# Altium integrated library Mastermind.IntLib: 985 symbols (part 3 of 6) (continued)
## PatchAntenna (continued)
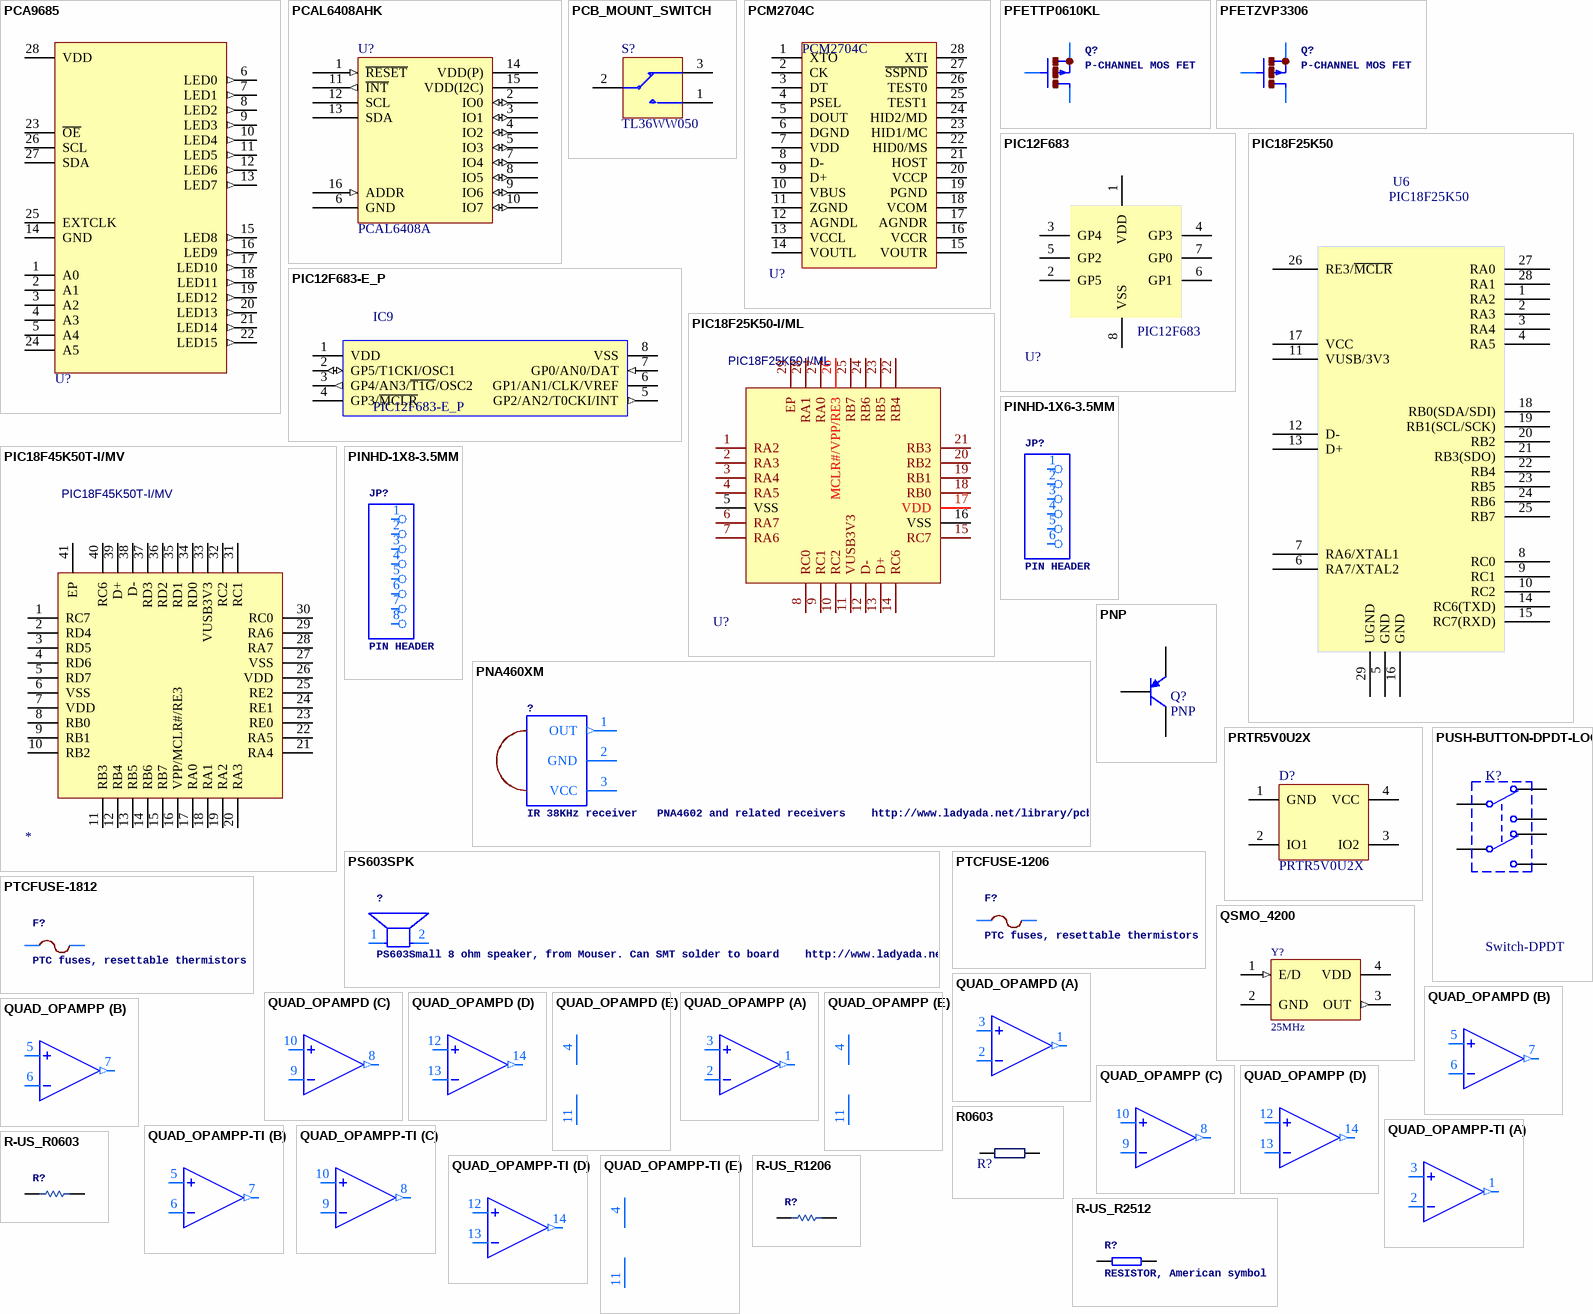
[diagram p20: symbols PCA9685 to R-US_R2512]

## PCA9685
designator U?, comment PCA9685 - 16 Channel 12-Bit I2C PWM Controller    5.0V tolerant 16 channel, 12-bit I2C PWM controller with 25mA per output (max. 400mA total)   Digikey: 568-5931-1-ND  (value not drawn)
footprint TSSOP28
pins: 1 A0, 2 A1, 3 A2, 4 A3, 5 A4, 6 LED0 (out), 7 LED1 (out), 8 LED2 (out), 9 LED3 (out), 10 LED4 (out), 11 LED5 (out), 12 LED6 (out), 13 LED7 (out), 14 GND, 15 LED8 (out), 16 LED9 (out), 17 LED10 (out), 18 LED11 (out), 19 LED12 (out), 20 LED13 (out), 21 LED14 (out), 22 LED15 (out), 23 ~{OE}, 24 A5, 25 EXTCLK, 26 SCL, 27 SDA, 28 VDD

## PCAL6408AHK
designator U?, comment PCAL6408A
8-bit I2C-bus I/O expander with interrupt output; Part Number: PCAL6408AHK; Manufacturer: NXP Semiconductors; 2nd source part number: 771-PCAL6408AHKX; Artikkelnr Noca: N.A.; Manufacturer Part Number: PCAL6408AHK; Datasheet: http://www.nxp.com/documents/data_sheet/PCAL6408A.pdf; Footprint Doc: XQFN-16; LatestRevisionDate: 2015-04-29; Pin Count: 16; Publisher: Nordic Semiconductor; Published: 2015-04-29; Value: PCAL6408A; Note: *; Supplier: Digi-Key; Supplier part number: 568-9944-2-ND; 2nd source Supplier: Mouser; Artikkelnr Simpro: N.A.
footprint XQFN40P180X260X50-16N
pins: 1 ~{RESET} (in), 2 IO0 (io), 3 IO1 (io), 4 IO2 (io), 5 IO3 (io), 6 GND (power), 7 IO4 (io), 8 IO5 (io), 9 IO6 (io), 10 IO7 (io), 11 ~{INT} (out), 12 SCL (power), 13 SDA, 14 VDD(P) (power) "VDD 2.3V - 5.5V", 15 VDD(I2C) (power), 16 ADDR (in)

## PCB_MOUNT_SWITCH
designator S?, comment TL36WW050
SPDT Subminiature Toggle Switch; Supplier: FARNELL; Supplier Code: 150-559
footprint PCB_SWITCH
3D model SPST_Switch (PCB3D Model)
pins: 1, 2, 3

## PCM2704C
designator U?
USB to Audio
footprint SOP65P780X200-28N
pins: 1 XTO, 2 CK, 3 DT, 4 PSEL, 5 DOUT, 6 DGND, 7 VDD, 8 D-, 9 D+, 10 VBUS, 11 ZGND, 12 AGNDL, 13 VCCL, 14 VOUTL, 15 VOUTR, 16 VCCR, 17 AGNDR, 18 VCOM, 19 PGND, 20 VCCP, 21 HOST, 22 HID0/MS, 23 HID1/MC, 24 HID2/MD, 25 TEST1, 26 TEST0, 27 ~{SSPND}, 28 XTI

## PFETTP0610KL
designator Q?, comment P-CHANNEL MOS FET
footprint TO92-OVAL
pins: 1 S, 2 G, 3 D

## PFETZVP3306
designator Q?, comment P-CHANNEL MOS FET
footprint TO92-OVAL
pins: 1 S, 2 G, 3 D

## PIC12F683
designator U?  Name: PIC12F683
footprint SOIC-8E (SOIC, 8-Leads, Body 4.90x3.90mm, Pitch 1.27mm, IPC Medium Density)
pins: 1 VDD (power), 2 GP5, 3 GP4, 4 GP3 (power), 5 GP2, 6 GP1, 7 GP0, 8 VSS

## PIC12F683-E_P
designator IC9
Integrated Circuit; DETAILS: PIC series Microcontroller IC 8-Bit 20MHz 3.5KB (2K x 14) FLASH 8-PDIP; MFG: Microchip Technology; MFGPN: PIC12F683-E/P; VALUE: IC MCU 8BIT 3.5KB FLASH; PACKAGE: 8DIP; URL: https://www.digikey.com/en/products/detail/microchip-technology/PIC12F683-E-P/613448?s=N4IgTCBcDaIAoEkDCBGMAxAbADgMwFoBRAejhAF0BfIA
footprint SOIC-8E (SOIC, 8-Leads, Body 4.90x3.90mm, Pitch 1.27mm, IPC Medium Density)
pins: 1 VDD (power), 2 GP5/T1CKI/OSC1 (io), 3 GP4/AN3/~{T1G}/OSC2 (out), 4 GP3/~{MCLR}, 5 GP2/AN2/T0CKI/INT (out), 6 GP1/AN1/CLK/VREF, 7 GP0/AN0/DAT (in), 8 VSS (power)

## PIC18F25K50
designator U6
Manufacturer 1: Microchip / Atmel; Manufacturer Part Number 1: ATMEGA16U2-AU; Core Architecture: AVR; Data Bus Width: 8b; RAM Size: 512B; Interface: SPI,UART,USB,USART,Serial; Number of Timers/Counters: 2; Max Supply Voltage: 5.5V; Min Supply Voltage: 2.7V; Frequency: 16MHz; Number of Programmable I/O: 22; Watchdog Timer: Yes; Memory Type: FLASH; Memory Size: 16KB; Number of PWM Channels: 5; Oscillator Type: Internal; Number of SPI Channels: 1; Peripherals: Brown-out Detect/Reset,POR,PWM,WDT; Supplier 1: Digi-Key; Stock 1: 1738; Pricing 1: 1=2.45000, 25=2.25000, 100=2.04000 (USD); RoHS: Yes; Mount: Surface Mount; Case/Package: A; Number of Pins: 32; Contact Plating: Tin,Matte; Min Operating Temperature: -40°C; Max Operating Temperature: 85°C; Package Quantity: 1250; Packaging: Tray; Max Frequency: 16MHz; Number of I/Os: 22; Length: 7mm; Height: 1.05mm; Width: 7mm; REACH SVHC: No SVHC; Lead Free: Lead Free; ComponentLink1URL: https://datasheet.ciiva.com/13036/doc7799-28769-13036800.pdf?src-supplier=Mouser; ComponentLink1Description: https://datasheet.ciiva.com/13036/doc7799-28769-13036800.pdf?src-supplier=Mouser; ComponentLink2URL: https://datasheet.ciiva.com/22651/doc7799-22651110.pdf?src-supplier=Farnell; ComponentLink2Description: https://datasheet.ciiva.com/22651/doc7799-22651110.pdf?src-supplier=Farnell; Supplier Part Number 1: ATMEGA16U2-AU-ND
footprint QFN28-P0.65
pins: 1 RA2, 2 RA3, 3 RA4, 4 RA5, 5 GND, 6 RA7/XTAL2, 7 RA6/XTAL1, 8 RC0, 9 RC1, 10 RC2, 11 VUSB/3V3, 12 D-, 13 D+, 14 RC6(TXD), 15 RC7(RXD), 16 GND, 17 VCC, 18 RB0(SDA/SDI), 19 RB1(SCL/SCK), 20 RB2, 21 RB3(SDO), 22 RB4, 23 RB5, 24 RB6, 25 RB7, 26 RE3/~{MCLR}, 27 RA0, 28 RA1, 29 UGND

## PIC18F25K50-I/ML
designator U?
BOM_Manufacturer: MICROCHIP(美国微芯); Contributor: LCSC; BOM_Supplier: LCSC; BOM_Supplier Part: C184559; BOM_Manufacturer Part: PIC18F25K50-I/ML; BOM_JLCPCB Part Class: Extended Part; spicePre: U; spiceSymbolName: PIC18F25K50-I/ML
footprint QFN-28_L6.0-W6.0-P0.65-BL-EP
pins: 1 RA2, 2 RA3, 3 RA4, 4 RA5, 5 VSS, 6 RA7, 7 RA6, 8 RC0, 9 RC1, 10 RC2, 11 VUSB3V3, 12 D-, 13 D+, 14 RC6, 15 RC7, 16 VSS, 17 VDD, 18 RB0, 19 RB1, 20 RB2, 21 RB3, 22 RB4, 23 RB5, 24 RB6, 25 RB7, 26 MCLR#/VPP/RE3, 27 RA0, 28 RA1, 29 EP

## PIC18F45K50T-I/MV
designator *
BOM_Manufacturer: Microchip Tech; Contributor: LCSC; BOM_Supplier: LCSC; BOM_Supplier Part: C624362; BOM_Manufacturer Part: PIC18F45K50T-I/MV; BOM_JLCPCB Part Class: Extended Part; spicePre: U; spiceSymbolName: PIC18F45K50T-I/MV
footprint QFN-40_L5.0-W5.0-P0.40-BL-EP3.7
pins: 1 RC7, 2 RD4, 3 RD5, 4 RD6, 5 RD7, 6 VSS, 7 VDD, 8 RB0, 9 RB1, 10 RB2, 11 RB3, 12 RB4, 13 RB5, 14 RB6, 15 RB7, 16 VPP/MCLR#/RE3, 17 RA0, 18 RA1, 19 RA2, 20 RA3, 21 RA4, 22 RA5, 23 RE0, 24 RE1, 25 RE2, 26 VDD, 27 VSS, 28 RA7, 29 RA6, 30 RC0, 31 RC1, 32 RC2, 33 VUSB3V3, 34 RD0, 35 RD1, 36 RD2, 37 RD3, 38 D-, 39 D+, 40 RC6, 41 EP

## PINHD-1X6-3.5MM
designator JP?, comment PIN HEADER
footprint 1X06-3.5MM
pins: 1, 2, 3, 4, 5, 6

## PINHD-1X8-3.5MM
designator JP?, comment PIN HEADER
footprint 1X08-3.5MM
pins: 1, 2, 3, 4, 5, 6, 7, 8

## PNA460XM
designator ?, comment IR 38KHz receiver   PNA4602 and related receivers    http://www.ladyada.net/library/pcb/eaglelibrary.html
footprint PNA460XM
pins: 1 OUT (out), 2 GND (power), 3 VCC (power)

## PNP
designator Q?
PNP Bipolar Transistor; Published: 8-Jun-2000; LatestRevisionDate: 15-Jan-2003; LatestRevisionNote: PCB Footprint 'BCY-W3/D4.7' replaced; DatasheetVersion: 1997; PackageVersion: Sep-1998; PackageReference: TO-92A; Publisher: Altium Limited; PackageDescription: TO, Flat Index; 3 In-Line, Axial Leads; Body Dia. 4.5mm; Leads 0.51 x 0.48 mm (max); ComponentLink1Description: Manufacturer Link; ComponentLink1URL: http://www.fairchildsemi.com/; ComponentLink2Description: Datasheet; ComponentLink2URL: http://www.fairchildsemi.com/ds/2N%2F2N3906.pdf
simulation model 2N3906 (PNP)
signal-integrity model 2N3906
footprint SOT23
pins: 1 E, 2 B, 3 C

## PRTR5V0U2X
designator D?
Ultra low capacitance double rail-to-rail ESD protection diode; Manufacturer: NXP; 2nd source part number: 152-4157; Artikkelnr Noca: 10069015; Artikkelnr Simpro: N.A.; Part Number: PRTR5V0U2X; Manufacturer Part Number: PRTR5V0U2X; Datasheet: http://www.farnell.com/datasheets/109718.pdf; LatestRevisionDate: 2012-06-11; Publisher: Nordic Semiconductor; Published: 2012-06-11; Value: PRTR5V0U2X; Note: *; Supplier: Digi-Key; Supplier part number: 568-4140-1-ND; 2nd source Supplier: Farnell; Footprint Doc: SOT-143B
footprint SOT190P230X110-4L
pins: 1 GND, 2 IO1, 3 IO2, 4 VCC

## PS603SPK
designator ?, comment PS603Small 8 ohm speaker, from Mouser. Can SMT solder to board    http://www.ladyada.net/library/pcb/eaglelibrary.html
footprint PS603
pins: 1, 2

## PTCFUSE-1206
designator F?, comment PTC fuses, resettable thermistors
footprint F1206
footprint F1206 - NO
pins: 1, 2

## PTCFUSE-1812
designator F?, comment PTC fuses, resettable thermistors
footprint 1812
pins: 1, 2

## PUSH-BUTTON-DPDT-LOCK
designator K?, comment Switch-DPDT
Dual-Pole Dual-Throw button; Published: 24-Mar-1999; LatestRevisionDate: 17-Jul-2002; LatestRevisionNote: Re-released for DXP Platform.; PackageReference: DIP-P8; Publisher: Altium Limited; PackageDescription: Relay; 8 Leads
footprint SW-TH_BTSA-X-P-14
footprint SW-TH_BTSA-X-P-15
pins: 1, 2, 3, 4, 5, 6

## QSMO_4200
designator Y?, comment 25MHz
Surface Mount Crystal Oscillator
footprint QSMO_4200
3D model crystal (PCB3D Model)
pins: 1 E/D (in) "Low Disables Clock", 2 GND (power), 3 OUT (out) "Output", 4 VDD (power)

## QUAD_OPAMPD
designator IC?, comment OP AMPStandard quad package  (value not drawn)
footprint SO14
part A pins: 1 OUT (out), 2 -IN, 3 +IN
part B pins: 5 +IN, 6 -IN, 7 OUT (out)
part C pins: 8 OUT (out), 9 -IN, 10 +IN
part D pins: 12 +IN, 13 -IN, 14 OUT (out)
part E pins: 4 V+ (power), 11 V- (power)

## QUAD_OPAMPP
designator IC?, comment OP AMPStandard quad package  (value not drawn)
footprint DIL14
part A pins: 1 OUT (out), 2 -IN, 3 +IN
part B pins: 5 +IN, 6 -IN, 7 OUT (out)
part C pins: 8 OUT (out), 9 -IN, 10 +IN
part D pins: 12 +IN, 13 -IN, 14 OUT (out)
part E pins: 4 V+ (power), 11 V- (power)

## QUAD_OPAMPP-TI
designator IC?, comment OP AMPStandard quad package  (value not drawn)
footprint DIL14-LARDO
part A pins: 1 OUT (out), 2 -IN, 3 +IN
part B pins: 5 +IN, 6 -IN, 7 OUT (out)
part C pins: 8 OUT (out), 9 -IN, 10 +IN
part D pins: 12 +IN, 13 -IN, 14 OUT (out)
part E pins: 4 V+ (power), 11 V- (power)

## R0603
designator R?, comment 5%  (value not drawn)
Chip resistor
footprint R0805
footprint R0603
footprint R1206
pins: 1, 2

## R-US_R0603
designator R?
RESISTOR, American symbol; Parameter 1: *
footprint R0603
pins: 1, 2

## R-US_R1206
designator R?  (value not drawn)
RESISTOR, American symbol
footprint R1206
pins: 1, 2

## R-US_R2512
designator R?, comment RESISTOR, American symbol
footprint R2512
pins: 1, 2

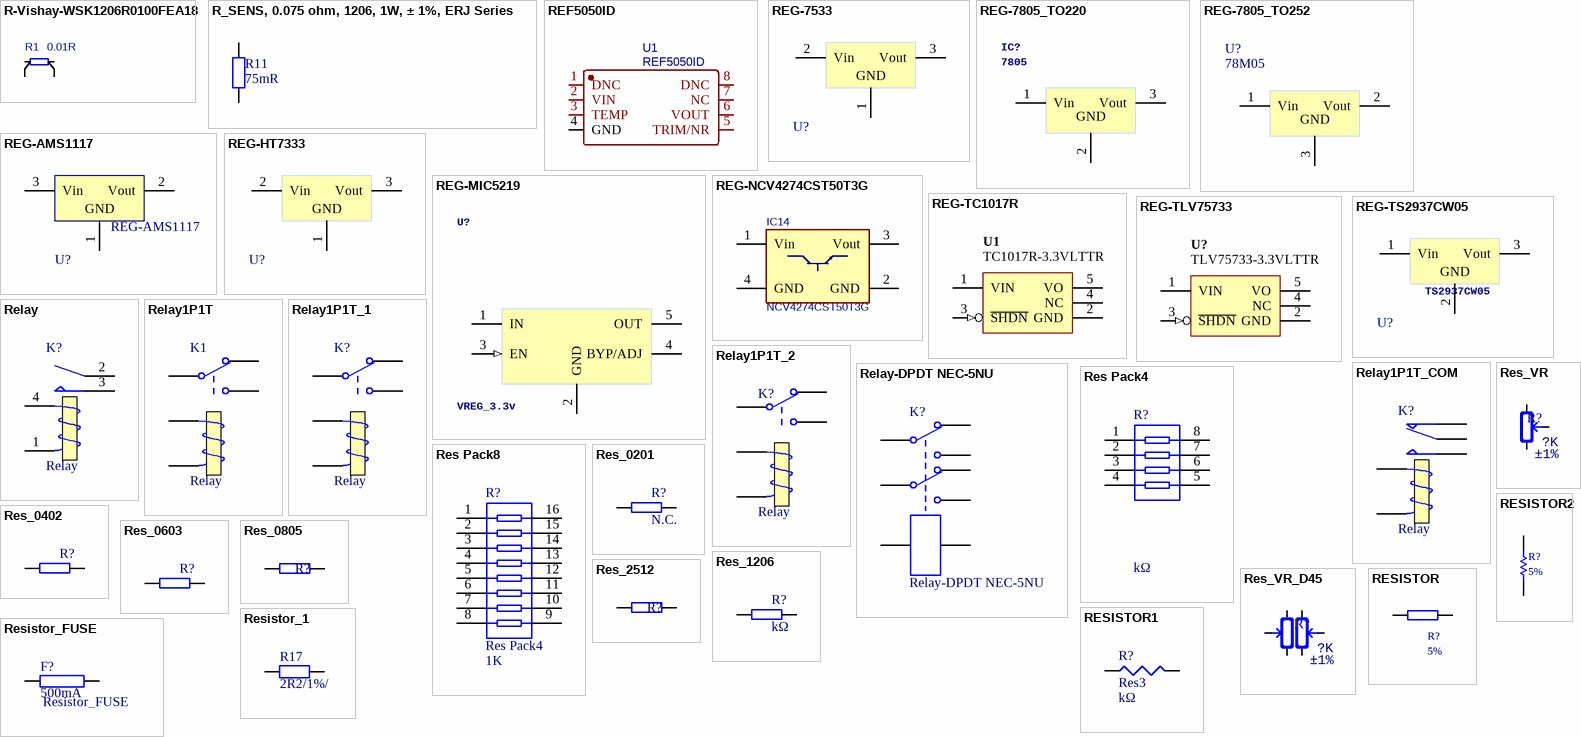
[diagram p21: symbols R-Vishay-WSK1206R0100FEA18 to Resistor_FUSE]

## R-Vishay-WSK1206R0100FEA18
designator R1, comment 0.01R
10 mOhms ±1% 0.5W,Chip Resistor 1206 (3216 Metric) Current Sense, Moisture Resistant, Pulse Withstanding Metal Element; Manufacturer Name: Vishay; Manufacturer Part No.: WSK1206R0100FEA18; Rating: 0.5W; Tolerance: 1%; Value: 0.01R; ClassName: Power_Poly
footprint RESWSK1206 (4-terminal resistor 1206 (3216 metric))
pins: 1, 2, 3, 4

## R_SENS, 0.075 ohm, 1206, 1W, ± 1%, ERJ Series
designator R11, comment 75mR
SMD Chip Resistor, Thick Film, Current Sense Resistors - SMD 1W 0.075ohm 1%; MPN: ERJ-8BWFR075V; VoltageRating: 50V; Temp coefficient: *ppm; MF: Panasonic Electronic Components; Precision: 1%; PowerRating: 1W; Resistance: 75mR
footprint R1206 (1206 resistor)
pins: 1, 2

## REF5050ID
designator U1
BOM_Manufacturer: TI(德州仪器); Contributor: LCSC; BOM_Supplier: LCSC; BOM_Supplier Part: C1575348; BOM_Manufacturer Part: REF5050ID; link: https://atta.szlcsc.comnull; BOM_JLCPCB Part Class: Extended Part; spicePre: U; spiceSymbolName: REF5050ID
footprint SOIC-8E (SOIC, 8-Leads, Body 4.90x3.90mm, Pitch 1.27mm, IPC Medium Density)
pins: 1 DNC, 2 VIN, 3 TEMP, 4 GND, 5 TRIM/NR, 6 VOUT, 7 NC, 8 DNC

## REG-7533
designator U?, comment HT7333  (value not drawn)
3.3VLTTR 250ma, 3.3V Micropower Low Dropout Regulator, 5-Pin SC70-5; @Comment: *
footprint SOT89-3
pins: 1 GND, 2 Vin, 3 Vout

## REG-7805_TO220
designator IC?, comment 7805
5V Linear Regulator
footprint TO220
pins: 1 Vin, 2 GND, 3 Vout

## REG-7805_TO252
designator U?, comment 78M05
5V Linear Regulator
footprint TO252
pins: 1 Vin, 2 Vout, 3 GND

## REG-AMS1117
designator U?
3V3 700ma Linear Regualtor; Max Input Voltage: 12V
footprint SOT223
footprint SOT89-3
pins: 1 GND, 2 Vout, 3 Vin

## REG-HT7333
designator U?, comment HT7333  (value not drawn)
3.3VLTTR 250ma, 3.3V Micropower Low Dropout Regulator, 5-Pin SC70-5; @Comment: *
footprint SOT89-3
pins: 1 GND, 2 Vin, 3 Vout

## REG-MIC5219
designator U?, comment VREG_3.3v
LOW DROPOUT REGULATORS(LDO) POSITIVE FIXED 600MV @ 500MA 12V 3.3V 500MA SOT-23-5 ROHS
footprint SOT23-5L
pins: 1 IN, 2 GND, 3 EN (in), 4 BYP/ADJ, 5 OUT

## REG-NCV4274CST50T3G
designator IC14, comment NCV4274CST50T3G
LDO regulator, Vout = 5V, Iout(max) = 0.4A, Vin = 5.5V to 40V, SOT-223; Manufacturer Name: ON Semiconductor; Manufacturer Part No.: NCV4274CST50T3G
footprint T_ON_NCV4264-2ST50T3G (SO4)
pins: 1 Vin, 2 GND, 3 Vout, 4 GND

## REG-TC1017R
designator U1, comment TC1017R-3.3VLTTR
3.3VLTTR, 3.3V Micropower Low Dropout Regulator, 5-Pin SC70-5; Max Input Voltage: 5.5 V; Max Output Current: 150 mA; Min Input Voltage: mV; Supply Voltage: V; Max Output Voltage: 3.3 V; Min Output Voltage: mV; Mounting Technology: Surface Mount; Status: Unreleased; Temperature Range: -40 to 85 degC; Category: IC-Power
footprint SOT65P210X80-5N
pins: 1 VIN (power), 2 GND (power), 3 ~{SHDN} (in), 4 NC, 5 VO (power)

## REG-TLV75733
designator U?, comment TLV75733-3.3VLTTR
3.3VLTTR 1A, 3.3V Micropower Low Dropout Regulator, VINmax 5.5V; Max Output Current: 1000 mA; Min Input Voltage: mV; Supply Voltage: V; Max Input Voltage: 5.5 V; Max Output Voltage: 3.3 V; Min Output Voltage: mV; Mounting Technology: Surface Mount; Status: Unreleased; Temperature Range: -40 to 85 degC; Category: IC-Power
footprint SOT23-5L
pins: 1 VIN, 2 GND (power), 3 ~{SHDN} (in), 4 NC, 5 VO

## REG-TS2937CW05
designator U?, comment TS2937CW05
5V Linear Regulator
footprint SOT223
pins: 1 Vin, 2 GND, 3 Vout

## Relay
designator K?
SPST Relay; Published: 8-Jun-2000; LatestRevisionDate: 17-Jul-2002; LatestRevisionNote: Re-released for DXP Platform.; PackageReference: MODULE5B; Publisher: Altium Limited
footprint IMO SPST (Single-Pole Single-Throw Relay; 4 Leads)
pins: 1 COM, 2 NC, 3 NO, 4 T1

## Relay1P1T
designator K1, comment Relay
POW Relay; Published: 8-Jun-2000; LatestRevisionDate: 17-Jul-2002; LatestRevisionNote: Re-released for DXP Platform.; PackageReference: MODULE5B; Publisher: Altium Limited
footprint RELAY-TH_YX209E-S-112D
pins: 1 COIL1, 2 NC, 3 NO, 4 COM, 5 COIL2

## Relay1P1T_1
designator K?, comment Relay
POW Relay; Published: 8-Jun-2000; LatestRevisionDate: 17-Jul-2002; LatestRevisionNote: Re-released for DXP Platform.; PackageReference: MODULE5B; Publisher: Altium Limited
footprint Omron_G5LE_SPDT_Relay
pins: 1 COIL1, 2 NC, 3 NO, 4 COM, 5 COIL2

## Relay1P1T_2
designator K?, comment Relay
POW Relay; Published: 8-Jun-2000; LatestRevisionDate: 17-Jul-2002; LatestRevisionNote: Re-released for DXP Platform.; PackageReference: MODULE5B; Publisher: Altium Limited
footprint RELAYPTH3
pins: COIL1 T1, COIL2 COM, MAIN 1, NC 2, NO 3

## Relay1P1T_COM
designator K?, comment Relay
POW Relay; Published: 8-Jun-2000; LatestRevisionDate: 17-Jul-2002; LatestRevisionNote: Re-released for DXP Platform.; PackageReference: MODULE5B; Publisher: Altium Limited
footprint RELAY-SL-SRD
footprint FINDER 40.31.9.005
pins: A1 T1, A2 COM, COM 2, NC 1, NO 3

## Relay-DPDT NEC-5NU
designator K?
Dual-Pole Dual-Throw Relay; Published: 24-Mar-1999; LatestRevisionDate: 17-Jul-2002; LatestRevisionNote: Re-released for DXP Platform.; PackageReference: DIP-P8; Publisher: Altium Limited; PackageDescription: Relay; 8 Leads
footprint NEC-5NU-DIP
pins: 1 7, 2, 3 1, 4 3, 5 6, 6 4, 7 5, 8

## Res Pack4
designator R?, comment kΩ
SMD Resitor Array; Published: 24-Mar-1999; LatestRevisionDate: 29-May-2009; LatestRevisionNote: IPC-7351 Footprint Added.; PackageVersion: Oct-2003; PackageReference: SSOP16; Publisher: Altium Limited; PackageDescription: 16-Pin Plastic Small Outline Package 0.65 mm Pitch; Code_JEDEC: MO-150-AC; Code_IPC: SOP65P780-16; Value: kΩ
footprint RES-ARRAY-SMD_8P-L3.2-W1.6-P0.80-BL-2
pins: 1, 2, 3, 4, 5, 6, 7, 8

## Res Pack8
designator R?, comment Res Pack4  value 1K
Isolated Resistor Network; Published: 24-Mar-1999; LatestRevisionDate: 29-May-2009; LatestRevisionNote: IPC-7351 Footprint Added.; PackageVersion: Oct-2003; PackageReference: SSOP16; Publisher: Altium Limited; PackageDescription: 16-Pin Plastic Small Outline Package 0.65 mm Pitch; Code_JEDEC: MO-150-AC; Code_IPC: SOP65P780-16
footprint SSOP16_N (SOP, 16-Leads, Body 6.2x5.3mm, Pitch 0.65mm, IPC Medium Density)
footprint SSOP16_L (SOP, 16-Leads, Body 6.2x5.3mm, Pitch 0.65mm, IPC High Density)
footprint SSOP16_M (SOP, 16-Leads, Body 6.2x5.3mm, Pitch 0.65mm, IPC Low Density)
simulation model respack_8 (Spice Subcircuit)
footprint RES-ARRAY-SMD_0603-16P-L6.4-W1.6-TL
pins: 1, 2, 3, 4, 5, 6, 7, 8, 9, 10, 11, 12, 13, 14, 15, 16

## Res_0201
designator R?, comment N.C.
Resistor; Part Number: R0402-N.C.; Note: Chip Res; Artikkelnr Noca: N.A.; Manufacturer: *; Manufacturer Part Number: *; Datasheet: *; Footprint Doc: 0201; LatestRevisionDate: 2009-05-08; Pin Count: 2; Publisher: Nordic Semiconductor; Published: 2009-05-08; Value: N.C.; Supplier: *; Supplier part number: *; 2nd source Supplier: *; 2nd source part number: *; Artikkelnr Simpro: N.A.
pins: 1, 2

## Res_0402
designator R?, comment kΩ  (value not drawn)
Resistor, ±1%, 0.100W; Part Number: R0402-N.C.; Note: Chip Res; Artikkelnr Noca: N.A.; Manufacturer: *; Manufacturer Part Number: *; Datasheet: *; Footprint Doc: 0402; LatestRevisionDate: 2009-05-08; Pin Count: 2; Publisher: Nordic Semiconductor; Published: 2009-05-08; Value: kΩ; Supplier: *; Supplier part number: *; 2nd source Supplier: *; 2nd source part number: *; Artikkelnr Simpro: N.A.
footprint R0402-NO
footprint R0402
pins: 1, 2

## Res_0603
designator R?, comment kΩ  (value not drawn)
Resistor, ±1%, 0.100W; Part Number: R0603-N.C.Ω; Manufacturer: N.A.; Note: Chip Res; Manufacturer Part Number: N.A.; Datasheet: *; Footprint Doc: 0603; LatestRevisionDate: 2009-05-08; Pin Count: 2; Publisher: Nordic Semiconductor; Published: 2009-05-08; Value: kΩ; Supplier: *; Supplier part number: *; 2nd source Supplier: *; 2nd source part number: *; Artikkelnr Noca: N.A.; Artikkelnr Simpro: N.A.
footprint R0603
footprint R0603-NO
pins: 1, 2

## Res_0805
designator R?, comment kΩ  (value not drawn)
Resistor, ±1%, 0.200W; Manufacturer: *; Specification: ±1%; Value: kΩ
footprint R0805-NO
footprint R0805
pins: 1, 2

## Res_1206
designator R?, comment kΩ
Resistor, ±1%, 0.400W; Part Number: R0603-N.C.Ω; Note: Chip Res; Artikkelnr Noca: N.A.; Manufacturer: *; Manufacturer Part Number: *; Datasheet: *; Footprint Doc: 0603; LatestRevisionDate: 2009-05-08; Pin Count: 2; Publisher: Nordic Semiconductor; Published: 2009-05-08; Value: kΩ; Supplier: *; Supplier part number: *; 2nd source Supplier: *; 2nd source part number: *; Artikkelnr Simpro: N.A.
footprint R1206
footprint R1206-NO
pins: 1, 2

## Res_2512
designator R?, comment R2512  (value not drawn)
Resistor; Specification: ±1%; Manufacturer: *
footprint RES_2512
pins: 1, 2

## Res_VR
designator R?, comment value ?K  Note: ±1%  (hidden comment: VR)
Resistor Variable; Manufacturer: *; Specification: ±1%; Type: VR
footprint RES_VR_Gear
pins: 1, 2, 3

## Res_VR_D45
designator R?, comment value ?K  Note: ±1%  (hidden comment: VR_D45)
Resistor Variable; Manufacturer: *; Specification: ±1%; Type: VR_D45
footprint RES_VR_D45mm
pins: 1 U, 2 W, 3 U, 4 W, 5 D, 6 D

## RESISTOR
designator R?, comment 5%
Chip Resistor; AEMS Code: 1200430
3D model SMT_0805 (PCB3D Model)
3D model SMT_0603 (PCB3D Model)
footprint R0603
footprint R0805
footprint R2512
footprint R1206
footprint R1812
footprint R1210
footprint 0204/7
footprint 0207/9
footprint 0207/10
pins: 1, 2

## RESISTOR1
designator R?, comment Res3  value kΩ
Chip Resistor; Published: 8-Jun-2000; LatestRevisionDate: 29-May-2009; LatestRevisionNote: IPC-7351 Footprint Added.; PackageReference: J1-0603; Publisher: Altium Limited; PackageDescription: Chip Resistor
footprint J1-0603 (Chip Resistor, Body 1.6x0.8mm, IPC High Density)
footprint 14-1210 (Chip Resistor, Body 3.2x2.5mm, IPC High Density)
footprint 12Z-2010 (Chip Resistor, Body 5.0x2.5mm, IPC High Density)
footprint RESC6332 (Chip Resistor, Body 6.3x3.2mm, IPC High Density)
simulation model RESISTOR (Resistor)
signal-integrity model Res
pins: 1, 2

## RESISTOR2
designator R?, comment 5%
Chip Resistor; AEMS Code: 1200430
footprint CC1005-0402 (0402 Resistor)
footprint CC1310-0504 (0504 Resistor)
footprint CC1608-0603
footprint CR2012-0805
footprint CC3216-1206 (1206 Resistor)
footprint CC3225-1210 (1210 Resistor)
footprint CC4513-1805 (1805 Resistor)
footprint CC2512 (2512 Resistor)
3D model SMT_0805 (PCB3D Model)
3D model SMT_0603 (PCB3D Model)
pins: 1, 2